# Altium integrated library Res-THP_V2.IntLib: 460 symbols (part 2 of 3)
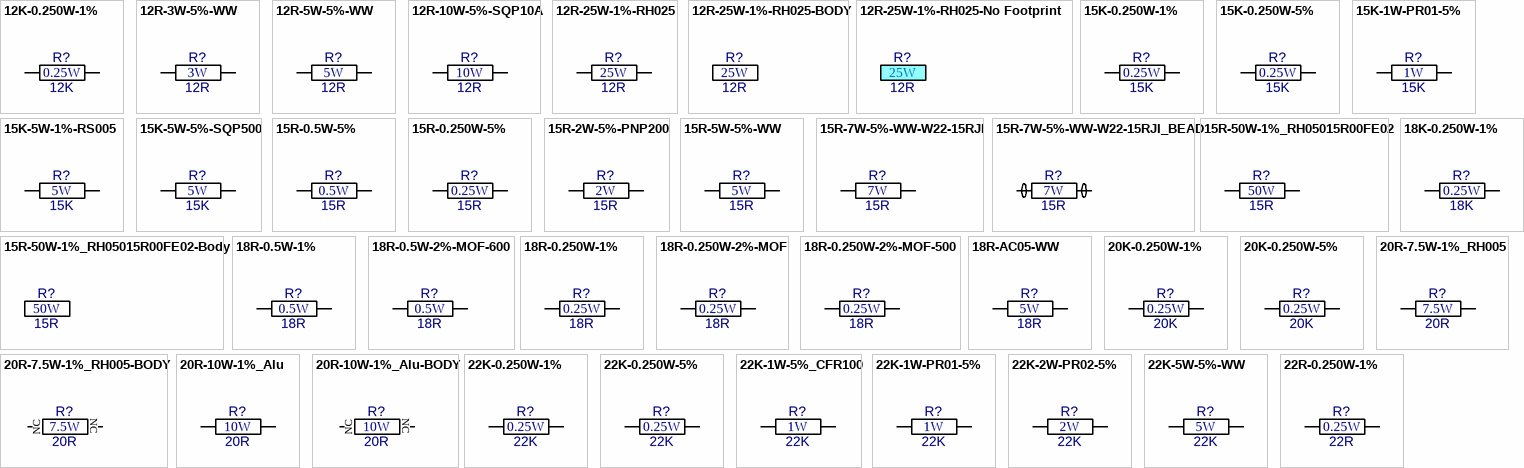
[diagram p12: symbols 12K-0.250W-1% to 22R-0.250W-1%]

## 15K-5W-1%-RS005
designator R?  value 15K  Watt: 5W  (hidden comment: 15K-5W-1%-RS005)
Resistor Wirewound; Manufacturer: Vishay; Part Number: RS00515K00FE12; Tol: 1%; Package: RES-RS005; EDM-PN: *; Text2: *; Text1: *
footprint RES-RS005 (RS005  22.23x7.92mm)
pins: 1, 2

## 15K-5W-5%-SQP500
designator R?  value 15K  Watt: 5W  (hidden comment: 15K-5W-5%-SQP500)
Resistor Cement; Manufacturer: Yageo; Part Number: SQP500JB-15K; Tol: 5%; Package: RES-SQP500; EDM-PN: *; Text2: *; Text1: *
footprint RES-SQP500 (SQP500  22.0x9.5mm)
pins: 1, 2

## 15R-0.5W-5%
designator R?, comment value 15R  Watt: 0.5W  (hidden comment: 15R-0.5W-5%_H)
Resistor Carbon; Manufacturer: Various; Part Number: 15R 5% 0.5W; Tol: 5%; Package: RES-0.5W; EDM-PN: *; Text2: *; Text1: *
footprint RES-0.5W (RES-0.5W 10.0x3.8mm)
pins: 1, 2

## 15R-0.250W-5%
designator R?, comment value 15R  Watt: 0.25W  (hidden comment: 15R-0.250W-5%_H)
Resistor Carbon; Manufacturer: Various; Part Number: 15R 5% 0.25W; Tol: 5%; Package: RES-0.250W; EDM-PN: *; Text2: *; Text1: *
footprint RES-0.250W (Res 0.25W 7.6x2.3mm)
pins: 1, 2

## 15R-2W-5%-PNP200
designator R?, comment value 15R  Watt: 2W  (hidden comment: PNP200JR-52-15R)
Resistor Wirewound Flame Retardant Safety; Manufacturer: Yageo; Tol: 5%; Part Number: PNP200JR-52-15R; Package: RES-PNP200; EDM-PN: *; Text2: *; Text1: *
footprint RES-PNP200 (RES PNP200 9.0x3.5mm)
pins: 1, 2

## 15R-5W-5%-WW
designator R?  value 15R  Watt: 5W  (hidden comment: 15R-5W-5%-WW)
Resistor Wirewound; Manufacturer: Various; Part Number: 15R 5% 5W WW; Tol: 5%; Package: RES-5W-WW; EDM-PN: *; Text2: *; Text1: *
footprint Res-5W-WW (Res 5W WW 17.0x7.5mm)
pins: 1, 2

## 15R-7W-5%-WW-W22-15RJI
designator R?, comment value 15R  Watt: 7W  (hidden comment: W22-15RJI)
Resistor Wirewound; Manufacturer: TT Electronics/Welwyn; Tol: 5%; Part Number: W22-15RJI; Package: RES-W22; EDM-PN: *; Text2: *; Text1: *
footprint Res-W22 (Res W22 22.0x8.0mm)
pins: 1, 2

## 15R-7W-5%-WW-W22-15RJI_BEAD
designator R?, comment value 15R  Watt: 7W  (hidden comment: W22-15RJI)
Resistor Wirewound and Bead; Manufacturer: TT Electronics/Welwyn & RS; Part Number: W22-15RJI & 536-4062; Tol: 5%; Package: RES-W22-BEAD; EDM-PN: *; Text2: *; Text1: *
footprint Res-W22 (Res W22 22.0x8.0mm)
pins: 1, 2

## 15R-50W-1%_RH05015R00FE02
designator R?, comment value 15R  Watt: 50W  (hidden comment: RH05015R00FE02)
Resistor Chassis Mount Aluminum 50Watt; Manufacturer: Vishay; Tol: 1%; Part Number: RH05015R00FE02; Package: RES-AL-50W; EDM-PN: *; Text2: *; Text1: *
footprint RES-AL-50W (Aluminum 50Watt 50.0x29.0mm)
pins: 1, 2

## 15R-50W-1%_RH05015R00FE02-Body
designator R?, comment value 15R  Watt: 50W  (hidden comment: RH05015R00FE02)
Resistor Chassis Mount Aluminum 50Watt; Manufacturer: Vishay; Tol: 1%; Part Number: RH05015R00FE02; Package: RES-AL-50W Body; EDM-PN: *; Text2: *; Text1: *
footprint RES-AL-50W Body (Aluminum 50Watt 50.0x29.0mm)

## 18K-0.250W-1%
designator R?, comment value 18K  Watt: 0.25W  (hidden comment: 18K-0.250W-1%_H)
Resistor Metal Film; Manufacturer: Various; Part Number: 18K 1% 0.25W; Tol: 1%; Package: RES-0.250W; EDM-PN: *; Text2: *; Text1: *
footprint RES-0.250W (Res 0.25W 7.6x2.3mm)
pins: 1, 2

## 18R-0.5W-1%
designator R?, comment value 18R  Watt: 0.5W  (hidden comment: 18R-0.5W-1%_H)
Resistor Metal Film; Manufacturer: Various; Part Number: 18R 1% 0.5W; Tol: 1%; Package: RES-0.5W; EDM-PN: *; Text2: *; Text1: *
footprint RES-0.5W (RES-0.5W 10.0x3.8mm)
pins: 1, 2

## 18R-0.5W-2%-MOF-600
designator R?, comment value 18R  Watt: 0.5W  (hidden comment: 18R-0.5W-2%)
Resistor Metal Oxide Film; Manufacturer: Various; Part Number: 18R 2% 0.5W MOF; Tol: 2%; Package: RES-0.5W-600; EDM-PN: *; Text2: *; Text1: *
footprint RES-0.5W-600 (RES-0.5W 10.0x3.8mm)
pins: 1, 2

## 18R-0.250W-1%
designator R?, comment value 18R  Watt: 0.25W  (hidden comment: 18R-0.250W-1%_H)
Resistor Metal Film; Manufacturer: Various; Part Number: 18R 1% 0.25W; Tol: 1%; Package: RES-0.250W; EDM-PN: *; Text2: *; Text1: *
footprint RES-0.250W (Res 0.25W 7.6x2.3mm)
pins: 1, 2

## 18R-0.250W-2%-MOF
designator R?, comment value 18R  Watt: 0.25W  (hidden comment: 18R-0.250W-2%)
Resistor Metal Oxide Film; Manufacturer: Various; Part Number: 18R 2% 0.25W MOF; Tol: 2%; Package: RES-0.250W; EDM-PN: *; Text2: *; Text1: *
footprint RES-0.250W (Res 0.25W 7.6x2.3mm)
pins: 1, 2

## 18R-0.250W-2%-MOF-500
designator R?, comment value 18R  Watt: 0.25W  (hidden comment: 18R-0.250W-2%)
Resistor Metal Oxide Film; Manufacturer: Various; Part Number: 18R 2% 0.25W MOF; Tol: 2%; Package: RES-0.250W-500; EDM-PN: *; Text2: *; Text1: *
footprint RES-0.250W-500 (Res 0.25W 7.6x2.3mm)
pins: 1, 2

## 18R-AC05-WW
designator R?  value 18R  Watt: 5W  (hidden comment: 18R-AC05-WW)
Resistor Wirewound; Manufacturer: Various; Part Number: 18R 5% AC05; Tol: 5%; Package: RES-AC05; EDM-PN: *; Text2: *; Text1: *
footprint Res-AC05 (Res AC05 18.0x10.0mm)
pins: 1, 2

## 20K-0.250W-1%
designator R?  value 20K  Watt: 0.25W  (hidden comment: 20K-0.250W-1%)
Resistor Metal Film; Manufacturer: Various; Part Number: 20K 1% 0.25W; Tol: 1%; Package: RES-0.250W; EDM-PN: *; Text2: *; Text1: *
footprint RES-0.250W (Res 0.25W 7.6x2.3mm)
pins: 1, 2

## 20K-0.250W-5%
designator R?, comment value 20K  Watt: 0.25W  (hidden comment: 20K-0.250W-5%_H)
Resistor Carbon; Manufacturer: Various; Part Number: 20K 5% 0.25W; Tol: 5%; Package: RES-0.250W; EDM-PN: *; Text2: *; Text1: *
footprint RES-0.250W (Res 0.25W 7.6x2.3mm)
pins: 1, 2

## 20R-7.5W-1%_RH005
designator R?  value 20R  Watt: 7.5W  (hidden comment: 20R-7.5W-1%_RH005)
Resistor Chassis Mount Aluminum 7.5Watt; Manufacturer: Vishay; Part Number: RH00520R00FC02; Tol: 1%; Package: RES-AL 5W; EDM-PN: *; Text2: *; Text1: *
footprint RES-AL 5W (RH005 11.28x8.84mm)
pins: 1, 2

## 20R-7.5W-1%_RH005-BODY
designator R?, comment value 20R  Watt: 7.5W  (hidden comment: 20R-7.5W-1%_RH005)
Resistor Chassis Mount Aluminum 7.5Watt; Manufacturer: Vishay; Part Number: RH00520R00FC02; Tol: 1%; Package: RES-AL 5W Body; EDM-PN: *; Text2: *; Text1: *
footprint RES-AL 5W Body (RH005 11.28x8.84mm)
text: NC

## 20R-10W-1%_Alu
designator R?  value 20R  Watt: 10W  (hidden comment: 20R-10W-1%_Alu)
Resistor Chassis Mount Aluminum; Manufacturer: Various; Part Number: 20R 10W 1% Aluminum; Tol: 1%; Package: RES-AL 10W; EDM-PN: *; Text2: *; Text1: *
footprint RES-AL 10W (RH010 19.2x21.0mm)
pins: 1, 2

## 20R-10W-1%_Alu-BODY
designator R?, comment value 20R  Watt: 10W  (hidden comment: 20R-10W-1%_Alu)
Resistor Chassis Mount Aluminum; Manufacturer: Various; Part Number: 20R 10W 1% Aluminum; Tol: 1%; Package: RES-AL 10W Body; EDM-PN: *; Text2: *; Text1: *
footprint RES-AL 10W Body (RH010 19.2x21.0mm)
text: NC

## 22K-0.250W-1%
designator R?, comment value 22K  Watt: 0.25W  (hidden comment: 22K-0.250W-1%_H)
Resistor Metal Film; Manufacturer: Various; Part Number: 22K 1% 0.25W; Tol: 1%; Package: RES-0.250W; EDM-PN: *; Text2: *; Text1: *
footprint RES-0.250W (Res 0.25W 7.6x2.3mm)
pins: 1, 2

## 22K-0.250W-5%
designator R?, comment value 22K  Watt: 0.25W  (hidden comment: 22K-0.250W-5%_H)
Resistor Carbon; Manufacturer: Various; Part Number: 22K 5% 0.25W; Tol: 5%; Package: RES-0.250W; EDM-PN: *; Text2: *; Text1: *
footprint RES-0.250W (Res 0.25W 7.6x2.3mm)
pins: 1, 2

## 22K-1W-5%_CFR100
designator R?, comment value 22K  Watt: 1W  (hidden comment: CFR100J22K)
Resistor Carbon Film; Manufacturer: Tyco; Tol: 5%; Part Number: CFR100J22K; Package: RES-CFR100; EDM-PN: *; Text2: *; Text1: *
footprint RES-CFR100 (RES CFR100 12.0x5.0mm)
pins: 1, 2

## 22K-1W-PR01-5%
designator R?  value 22K  Watt: 1W  (hidden comment: 22K-1W-PR01-5%)
Resistor Power Metal Film; Manufacturer: Various; Part Number: 22K 5% 1W; Tol: 5%; Package: RES-PR01; EDM-PN: *; Text2: *; Text1: *
footprint RES-PR01 (RES-PR01 6.5x2.5mm)
pins: 1, 2

## 22K-2W-PR02-5%
designator R?  value 22K  Watt: 2W  (hidden comment: 22K-2W-PR02-5%)
Resistor Power Metal Film; Manufacturer: Various; Part Number: 22K 5% 2W; Tol: 5%; Package: RES-PR02; EDM-PN: *; Text2: *; Text1: *
footprint RES-PR02 (RES 2W PMW 10.0x3.9mm)
pins: 1, 2

## 22K-5W-5%-WW
designator R?  value 22K  Watt: 5W  (hidden comment: 22K-5W-5%-WW)
Resistor Wirewound; Manufacturer: Various; Part Number: 22K 5% 5W WW; Tol: 5%; Package: RES-5W-WW; EDM-PN: *; Text2: *; Text1: *
footprint Res-5W-WW (Res 5W WW 17.0x7.5mm)
pins: 1, 2

## 22R-0.250W-1%
designator R?, comment value 22R  Watt: 0.25W  (hidden comment: 22R-0.250W-1%_H)
Resistor Metal Film; Manufacturer: Various; Part Number: 22R 1% 0.25W; Tol: 1%; Package: RES-0.250W; EDM-PN: *; Text2: *; Text1: *
footprint RES-0.250W (Res 0.25W 7.6x2.3mm)
pins: 1, 2

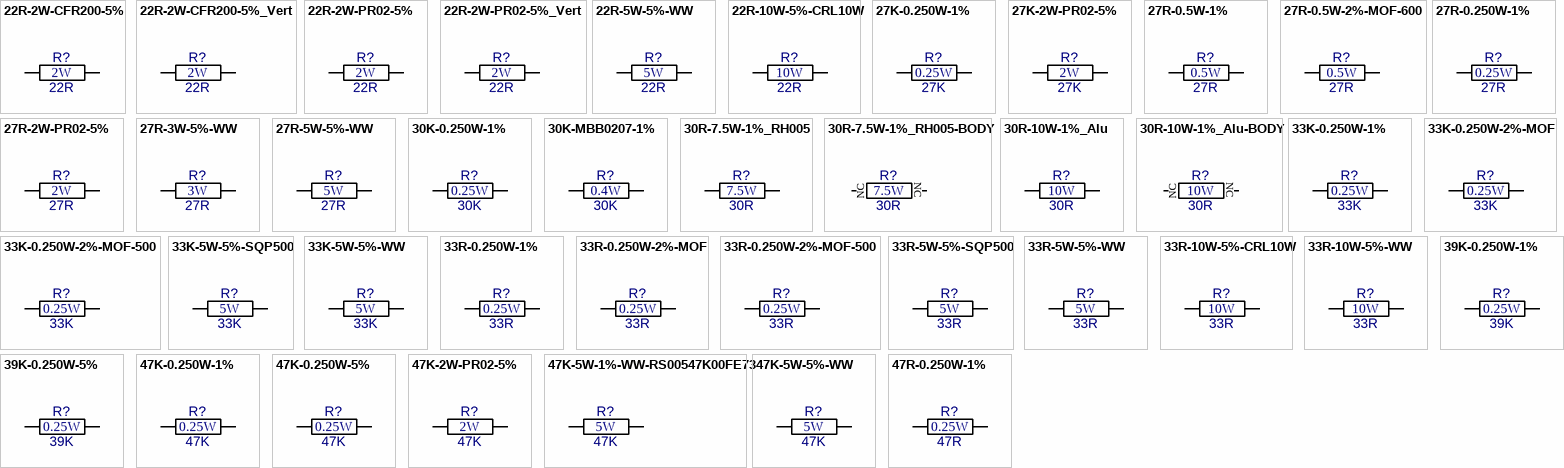
[diagram p6: symbols 22R-2W-CFR200-5% to 47R-0.250W-1%]

## 22R-2W-CFR200-5%
designator R?, comment value 22R  Watt: 2W  (hidden comment: CFR200J22R)
Resistor Carbon Film; Manufacturer: Various; Tol: 5%; Part Number: CFR200J22R; Package: RES-CFR200; EDM-PN: *; Text2: *; Text1: *
footprint Res-CFR200 (Res CFR200 16.0x5.5mm)
pins: 1, 2

## 22R-2W-CFR200-5%_Vert
designator R?, comment value 22R  Watt: 2W  (hidden comment: CFR200J22R)
Resistor Carbon Film; Manufacturer: Various; Tol: 5%; Part Number: CFR200J22R; Package: Res-CFR200-Vert; EDM-PN: *; Text2: *; Text1: *
footprint Res-CFR200-Vert (Res CFR200 16.0x5.5mm)
pins: 1, 2

## 22R-2W-PR02-5%
designator R?  value 22R  Watt: 2W  (hidden comment: 22R-2W-PR02-5%)
Resistor Power Metal Film; Manufacturer: Various; Part Number: 22R 5% 2W; Tol: 5%; Package: RES-PR02; EDM-PN: *; Text2: *; Text1: *
footprint RES-PR02 (RES 2W PMW 10.0x3.9mm)
pins: 1, 2

## 22R-2W-PR02-5%_Vert
designator R?, comment value 22R  Watt: 2W  (hidden comment: 22R-2W-PR02-5%)
Resistor Power Metal Film; Manufacturer: Various; Part Number: 22R 5% 2W; Tol: 5%; Package: RES-PR02-VERT; EDM-PN: *; Text2: *; Text1: *
footprint RES-PR02-VERT (RES 2W PMW 10.0x3.9mm Vertical)
pins: 1, 2

## 22R-5W-5%-WW
designator R?  value 22R  Watt: 5W  (hidden comment: 22R-5W-5%-WW)
Resistor Wirewound; Manufacturer: Various; Part Number: 22R 5% 5W WW; Tol: 5%; Package: RES-5W-WW; EDM-PN: *; Text2: *; Text1: *
footprint Res-5W-WW (Res 5W WW 17.0x7.5mm)
pins: 1, 2

## 22R-10W-5%-CRL10W
designator R?  value 22R  Watt: 10W  (hidden comment: 22R-10W-5%-CRL10W)
Resistor Wirewound Cement; Manufacturer: SR Passives; Part Number: CRL10W 22R 5%; Tol: 5%; Package: RES-CRL10W; EDM-PN: *; Text2: *; Text1: *
footprint RES-CRL10W (CRL10W  48.0x9.5mm)
pins: 1, 2

## 27K-0.250W-1%
designator R?, comment value 27K  Watt: 0.25W  (hidden comment: 27K-0.250W-1%_H)
Resistor Metal Film; Manufacturer: Various; Part Number: 27K 1% 0.25W; Tol: 1%; Package: RES-0.250W; EDM-PN: *; Text2: *; Text1: *
footprint RES-0.250W (Res 0.25W 7.6x2.3mm)
pins: 1, 2

## 27K-2W-PR02-5%
designator R?  value 27K  Watt: 2W  (hidden comment: 27K-2W-PR02-5%)
Resistor Power Metal Film; Manufacturer: Various; Part Number: 27K 5% 2W; Tol: 5%; Package: RES-PR02; EDM-PN: *; Text2: *; Text1: *
footprint RES-PR02 (RES 2W PMW 10.0x3.9mm)
pins: 1, 2

## 27R-0.5W-1%
designator R?, comment value 27R  Watt: 0.5W  (hidden comment: 27R-0.5W-1%_H)
Resistor Metal Film; Manufacturer: Various; Part Number: 27R 1% 0.5W; Tol: 1%; Package: RES-0.5W; EDM-PN: *; Text2: *; Text1: *
footprint RES-0.5W (RES-0.5W 10.0x3.8mm)
pins: 1, 2

## 27R-0.5W-2%-MOF-600
designator R?, comment value 27R  Watt: 0.5W  (hidden comment: 27R-0.5W-2%)
Resistor Metal Oxide Film; Manufacturer: Various; Part Number: 27R 2% 0.5W MOF; Tol: 2%; Package: RES-0.5W-600; EDM-PN: *; Text2: *; Text1: *
footprint RES-0.5W-600 (RES-0.5W 10.0x3.8mm)
pins: 1, 2

## 27R-0.250W-1%
designator R?, comment value 27R  Watt: 0.25W  (hidden comment: 27R-0.250W-1%_H)
Resistor Metal Film; Manufacturer: Various; Part Number: 27R 1% 0.25W; Tol: 1%; Package: RES-0.250W; EDM-PN: *; Text2: *; Text1: *
footprint RES-0.250W (Res 0.25W 7.6x2.3mm)
pins: 1, 2

## 27R-2W-PR02-5%
designator R?  value 27R  Watt: 2W  (hidden comment: 27R-2W-PR02-5%)
Resistor Power Metal Film; Manufacturer: Various; Part Number: 27R 5% 2W; Tol: 5%; Package: RES-PR02; EDM-PN: *; Text2: *; Text1: *
footprint RES-PR02 (RES 2W PMW 10.0x3.9mm)
pins: 1, 2

## 27R-3W-5%-WW
designator R?  value 27R  Watt: 3W  (hidden comment: 27R-3W-5%-WW)
Resistor Wirewound; Manufacturer: Various; Part Number: 27R 5% 3W WW; Tol: 5%; Package: RES-3W-WW; EDM-PN: *; Text2: *; Text1: *
footprint Res-3W-WW (Res 3W WW 13.0x5.5mm)
pins: 1, 2

## 27R-5W-5%-WW
designator R?  value 27R  Watt: 5W  (hidden comment: 27R-5W-5%-WW)
Resistor Wirewound; Manufacturer: Various; Part Number: 27R 5% 5W WW; Tol: 5%; Package: RES-5W-WW; EDM-PN: *; Text2: *; Text1: *
footprint Res-5W-WW (Res 5W WW 17.0x7.5mm)
pins: 1, 2

## 30K-0.250W-1%
designator R?, comment value 30K  Watt: 0.25W  (hidden comment: 30K-0.250W-1%_H)
Resistor Metal Film; Manufacturer: Various; Part Number: 30K 1% 0.25W; Tol: 1%; Package: RES-0.250W; EDM-PN: *; Text2: *; Text1: *
footprint RES-0.250W (Res 0.25W 7.6x2.3mm)
pins: 1, 2

## 30K-MBB0207-1%
designator R?, comment value 30K  Watt: 0.4W  (hidden comment: 30K-MBB0207-1%_H)
Resistor Metal Film; Manufacturer: Vishay; Part Number: 30K 1% MBB0207; Tol: 1%; Package: RES-MBB0207; EDM-PN: *; Text2: *; Text1: *; Reutech PN: 5905-99-0303
footprint RES-MBB0207 (MBB0207 6.3x2.5mm)
pins: 1, 2

## 30R-7.5W-1%_RH005
designator R?  value 30R  Watt: 7.5W  (hidden comment: 30R-7.5W-1%_RH005)
Resistor Chassis Mount Aluminum 7.5Watt; Manufacturer: Vishay; Part Number: RH00530R00FC02; Tol: 1%; Package: RES-AL 5W; EDM-PN: *; Text2: *; Text1: *
footprint RES-AL 5W (RH005 11.28x8.84mm)
pins: 1, 2

## 30R-7.5W-1%_RH005-BODY
designator R?, comment value 30R  Watt: 7.5W  (hidden comment: 30R-7.5W-1%_RH005)
Resistor Chassis Mount Aluminum 7.5Watt; Manufacturer: Vishay; Part Number: RH00530R00FC02; Tol: 1%; Package: RES-AL 5W Body; EDM-PN: *; Text2: *; Text1: *
footprint RES-AL 5W Body (RH005 11.28x8.84mm)
text: NC

## 30R-10W-1%_Alu
designator R?  value 30R  Watt: 10W  (hidden comment: 30R-10W-1%_Alu)
Resistor Chassis Mount Aluminum; Manufacturer: Various; Part Number: 30R 10W 1% Aluminum; Tol: 1%; Package: RES-AL 10W; EDM-PN: *; Text2: *; Text1: *
footprint RES-AL 10W (RH010 19.2x21.0mm)
pins: 1, 2

## 30R-10W-1%_Alu-BODY
designator R?, comment value 30R  Watt: 10W  (hidden comment: 30R-10W-1%_Alu)
Resistor Chassis Mount Aluminum; Manufacturer: Various; Part Number: 30R 10W 1% Aluminum; Tol: 1%; Package: RES-AL 10W Body; EDM-PN: *; Text2: *; Text1: *
footprint RES-AL 10W Body (RH010 19.2x21.0mm)
text: NC

## 33K-0.250W-1%
designator R?, comment value 33K  Watt: 0.25W  (hidden comment: 33K-0.250W-1%_H)
Resistor Metal Film; Manufacturer: Various; Part Number: 33K 1% 0.25W; Tol: 1%; Package: RES-0.250W; EDM-PN: *; Text2: *; Text1: *
footprint RES-0.250W (Res 0.25W 7.6x2.3mm)
pins: 1, 2

## 33K-0.250W-2%-MOF
designator R?, comment value 33K  Watt: 0.25W  (hidden comment: 33K-0.250W-2%)
Resistor Metal Oxide Film; Manufacturer: Various; Part Number: 33K 2% 0.25W MOF; Tol: 2%; Package: RES-0.250W; EDM-PN: *; Text2: *; Text1: *
footprint RES-0.250W (Res 0.25W 7.6x2.3mm)
pins: 1, 2

## 33K-0.250W-2%-MOF-500
designator R?, comment value 33K  Watt: 0.25W  (hidden comment: 33K-0.250W-2%)
Resistor Metal Oxide Film; Manufacturer: Various; Part Number: 33K 2% 0.25W MOF; Tol: 2%; Package: RES-0.250W-500; EDM-PN: *; Text2: *; Text1: *
footprint RES-0.250W-500 (Res 0.25W 7.6x2.3mm)
pins: 1, 2

## 33K-5W-5%-SQP500
designator R?  value 33K  Watt: 5W  (hidden comment: 33K-5W-5%-SQP500)
Resistor Cement Wirewound; Manufacturer: Yageo; Part Number: SQP500-33K-J; Tol: 5%; Package: RES-SQP500; EDM-PN: *; Text2: *; Text1: *
footprint RES-SQP500 (SQP500  22.0x9.5mm)
pins: 1, 2

## 33K-5W-5%-WW
designator R?  value 33K  Watt: 5W  (hidden comment: 33K-5W-5%-WW)
Resistor Wirewound; Manufacturer: Various; Part Number: 33K 5% 5W WW; Tol: 5%; Package: RES-5W-WW; EDM-PN: *; Text2: *; Text1: *
footprint Res-5W-WW (Res 5W WW 17.0x7.5mm)
pins: 1, 2

## 33R-0.250W-1%
designator R?, comment value 33R  Watt: 0.25W  (hidden comment: 33R-0.250W-1%_H)
Resistor Metal Film; Manufacturer: Various; Part Number: 33R 1% 0.25W; Tol: 1%; Package: RES-0.250W; EDM-PN: *; Text2: *; Text1: *
footprint RES-0.250W (Res 0.25W 7.6x2.3mm)
pins: 1, 2

## 33R-0.250W-2%-MOF
designator R?, comment value 33R  Watt: 0.25W  (hidden comment: 33R-0.250W-2%)
Resistor Metal Oxide Film; Manufacturer: Various; Part Number: 33R 2% 0.25W MOF; Tol: 2%; Package: RES-0.250W; EDM-PN: *; Text2: *; Text1: *
footprint RES-0.250W (Res 0.25W 7.6x2.3mm)
pins: 1, 2

## 33R-0.250W-2%-MOF-500
designator R?, comment value 33R  Watt: 0.25W  (hidden comment: 33R-0.250W-2%)
Resistor Metal Oxide Film; Manufacturer: Various; Part Number: 33R 2% 0.25W MOF; Tol: 2%; Package: RES-0.250W-500; EDM-PN: *; Text2: *; Text1: *
footprint RES-0.250W-500 (Res 0.25W 7.6x2.3mm)
pins: 1, 2

## 33R-5W-5%-SQP500
designator R?  value 33R  Watt: 5W  (hidden comment: 33R-5W-5%-SQP500)
Resistor Cement; Manufacturer: Yageo; Part Number: SQP500JB-33R; Tol: 5%; Package: RES-SQP500; EDM-PN: *; Text2: *; Text1: *
footprint RES-SQP500 (SQP500  22.0x9.5mm)
pins: 1, 2

## 33R-5W-5%-WW
designator R?  value 33R  Watt: 5W  (hidden comment: 33R-5W-5%-WW)
Resistor Wirewound; Manufacturer: Various; Part Number: 33R 5% 5W WW; Tol: 5%; Package: RES-5W-WW; EDM-PN: *; Text2: *; Text1: *
footprint Res-5W-WW (Res 5W WW 17.0x7.5mm)
pins: 1, 2

## 33R-10W-5%-CRL10W
designator R?  value 33R  Watt: 10W  (hidden comment: 33R-10W-5%-CRL10W)
Resistor Wirewound Cement; Manufacturer: SR Passives; Part Number: CRL10W 33R 5%; Tol: 5%; Package: RES-CRL10W; EDM-PN: *; Text2: *; Text1: *
footprint RES-CRL10W (CRL10W  48.0x9.5mm)
pins: 1, 2

## 33R-10W-5%-WW
designator R?  value 33R  Watt: 10W  (hidden comment: 33R-10W-5%-WW)
Resistor Wirewound; Manufacturer: Various; Part Number: 33R 5% 10W WW; Tol: 5%; Package: RES-10W-WW; EDM-PN: *; Text2: *; Text1: *
footprint Res-10W-WW (Res 10W WW 44.0x8.0mm)
pins: 1, 2

## 39K-0.250W-1%
designator R?, comment value 39K  Watt: 0.25W  (hidden comment: 39K-0.250W-1%_H)
Resistor Metal Film; Manufacturer: Various; Part Number: 39K 1% 0.25W; Tol: 1%; Package: RES-0.250W; EDM-PN: *; Text2: *; Text1: *
footprint RES-0.250W (Res 0.25W 7.6x2.3mm)
pins: 1, 2

## 39K-0.250W-5%
designator R?, comment value 39K  Watt: 0.25W  (hidden comment: 39K-0.250W-5%_H)
Resistor Carbon; Manufacturer: Various; Part Number: 39K 5% 0.25W; Tol: 5%; Package: RES-0.250W; EDM-PN: *; Text2: *; Text1: *
footprint RES-0.250W (Res 0.25W 7.6x2.3mm)
pins: 1, 2

## 47K-0.250W-1%
designator R?, comment value 47K  Watt: 0.25W  (hidden comment: 47K-0.250W-1%_H)
Resistor Metal Film; Manufacturer: Various; Part Number: 47K 1% 0.25W; Tol: 1%; Package: RES-0.250W; EDM-PN: *; Text2: *; Text1: *
footprint RES-0.250W (Res 0.25W 7.6x2.3mm)
pins: 1, 2

## 47K-0.250W-5%
designator R?, comment value 47K  Watt: 0.25W  (hidden comment: 47K-0.250W-5%_H)
Resistor Carbon; Manufacturer: Various; Part Number: 47K 5% 0.25W; Tol: 5%; Package: RES-0.250W; EDM-PN: *; Text2: *; Text1: *
footprint RES-0.250W (Res 0.25W 7.6x2.3mm)
pins: 1, 2

## 47K-2W-PR02-5%
designator R?  value 47K  Watt: 2W  (hidden comment: 47K-2W-PR02-5%)
Resistor Power Metal Film; Manufacturer: Various; Part Number: 47K 5% 2W; Tol: 5%; Package: RES-PR02; EDM-PN: *; Text2: *; Text1: *
footprint RES-PR02 (RES 2W PMW 10.0x3.9mm)
pins: 1, 2

## 47K-5W-1%-WW-RS00547K00FE73
designator R?, comment value 47K  Watt: 5W  (hidden comment: RS00547K00FE73)
Resistor Wirewound Moisture Resistant; Manufacturer: Vishay; Tol: 1%; Part Number: RS00547K00FE73; Package: RES-RS005; EDM-PN: *; Text2: *; Text1: *
footprint RES-RS005 (RS005  22.23x7.92mm)
pins: 1, 2

## 47K-5W-5%-WW
designator R?  value 47K  Watt: 5W  (hidden comment: 47K-5W-5%-WW)
Resistor Wirewound; Manufacturer: Various; Part Number: 47K 5% 5W WW; Tol: 5%; Package: RES-5W-WW; EDM-PN: *; Text2: *; Text1: *
footprint Res-5W-WW (Res 5W WW 17.0x7.5mm)
pins: 1, 2

## 47R-0.250W-1%
designator R?, comment value 47R  Watt: 0.25W  (hidden comment: 47R-0.250W-1%_H)
Resistor Metal Film; Manufacturer: Various; Part Number: 47R 1% 0.25W; Tol: 1%; Package: RES-0.250W; EDM-PN: *; Text2: *; Text1: *
footprint RES-0.250W (Res 0.25W 7.6x2.3mm)
pins: 1, 2

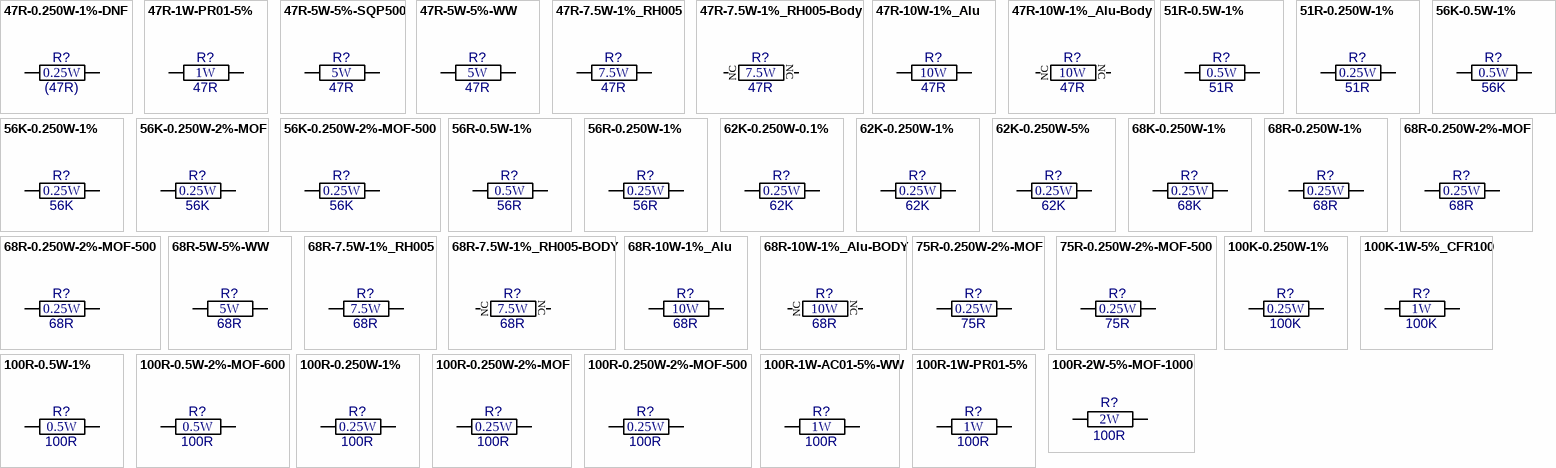
[diagram p7: symbols 47R-0.250W-1%-DNF to 100R-2W-5%-MOF-1000]

## 47R-0.250W-1%-DNF
designator R?, comment value (47R)  Watt: 0.25W  (hidden comment: 47R-0.250W-1%_H-DNF)
Resistor Metal Film - Do not Fit; Manufacturer: Various; Part Number: DNF - 47R 1% 0.25W; Tol: 1%; Package: RES-0.250W; EDM-PN: *; Text2: *; Text1: *
footprint RES-0.250W (Res 0.25W 7.6x2.3mm)
pins: 1, 2

## 47R-1W-PR01-5%
designator R?  value 47R  Watt: 1W  (hidden comment: 47R-1W-PR01-5%)
Resistor Power Metal Film; Manufacturer: Various; Part Number: 47R 5% 1W; Tol: 5%; Package: RES-PR01; EDM-PN: *; Text2: *; Text1: *
footprint RES-PR01 (RES-PR01 6.5x2.5mm)
pins: 1, 2

## 47R-5W-5%-SQP500
designator R?  value 47R  Watt: 5W  (hidden comment: 47R-5W-5%-SQP500)
Resistor Cement; Manufacturer: Yageo; Part Number: SQP500JB-47R; Tol: 5%; Package: RES-SQP500; EDM-PN: *; Text2: *; Text1: *
footprint RES-SQP500 (SQP500  22.0x9.5mm)
pins: 1, 2

## 47R-5W-5%-WW
designator R?  value 47R  Watt: 5W  (hidden comment: 47R-5W-5%-WW)
Resistor Wirewound; Manufacturer: Various; Part Number: 47R 5% 5W WW; Tol: 5%; Package: RES-5W-WW; EDM-PN: *; Text2: *; Text1: *
footprint Res-5W-WW (Res 5W WW 17.0x7.5mm)
pins: 1, 2

## 47R-7.5W-1%_RH005
designator R?  value 47R  Watt: 7.5W  (hidden comment: 47R-7.5W-1%_RH005)
Resistor Chassis Mount Aluminum 7.5Watt; Manufacturer: Vishay; Part Number: RH00547R00FC02; Tol: 1%; Package: RES-AL 5W; EDM-PN: *; Text2: *; Text1: *
footprint RES-AL 5W (RH005 11.28x8.84mm)
pins: 1, 2

## 47R-7.5W-1%_RH005-Body
designator R?, comment value 47R  Watt: 7.5W  (hidden comment: 47R-7.5W-1%_RH005)
Resistor Chassis Mount Aluminum 7.5Watt; Manufacturer: Vishay; Part Number: RH00547R00FC02; Tol: 1%; Package: RES-AL 5W Body; EDM-PN: *; Text2: *; Text1: *
footprint RES-AL 5W Body (RH005 11.28x8.84mm)
text: NC

## 47R-10W-1%_Alu
designator R?  value 47R  Watt: 10W  (hidden comment: 47R-10W-1%_Alu)
Resistor Chassis Mount Aluminum; Manufacturer: Various; Part Number: 47R 10W 1% Aluminum; Tol: 1%; Package: RES-AL 10W; EDM-PN: *; Text2: *; Text1: *
footprint RES-AL 10W (RH010 19.2x21.0mm)
pins: 1, 2

## 47R-10W-1%_Alu-Body
designator R?, comment value 47R  Watt: 10W  (hidden comment: 47R-10W-1%_Alu)
Resistor Chassis Mount Aluminum; Manufacturer: Various; Part Number: 47R 10W 1% Aluminum; Tol: 1%; Package: RES-AL 10W Body; EDM-PN: *; Text2: *; Text1: *
footprint RES-AL 10W Body (RH010 19.2x21.0mm)
text: NC

## 51R-0.5W-1%
designator R?, comment value 51R  Watt: 0.5W  (hidden comment: 51R-0.5W-1%_H)
Resistor Metal Film; Manufacturer: Various; Part Number: 51R 1% 0.5W; Tol: 1%; Package: RES-0.5W; EDM-PN: *; Text2: *; Text1: *
footprint RES-0.5W (RES-0.5W 10.0x3.8mm)
pins: 1, 2

## 51R-0.250W-1%
designator R?, comment value 51R  Watt: 0.25W  (hidden comment: 51R-0.250W-1%_H)
Resistor Metal Film; Manufacturer: Various; Part Number: 51R 1% 0.25W; Tol: 1%; Package: RES-0.250W; EDM-PN: *; Text2: *; Text1: *
footprint RES-0.250W (Res 0.25W 7.6x2.3mm)
pins: 1, 2

## 56K-0.5W-1%
designator R?, comment value 56K  Watt: 0.5W  (hidden comment: 56K-0.5W-1%_H)
Resistor Metal Film; Manufacturer: Various; Part Number: 56K 1% 0.5W; Tol: 1%; Package: RES-0.5W; EDM-PN: *; Text2: *; Text1: *
footprint RES-0.5W (RES-0.5W 10.0x3.8mm)
pins: 1, 2

## 56K-0.250W-1%
designator R?, comment value 56K  Watt: 0.25W  (hidden comment: 56K-0.250W-1%_H)
Resistor Metal Film; Manufacturer: Various; Part Number: 56K 1% 0.25W; Tol: 1%; Package: RES-0.250W; EDM-PN: *; Text2: *; Text1: *
footprint RES-0.250W (Res 0.25W 7.6x2.3mm)
pins: 1, 2

## 56K-0.250W-2%-MOF
designator R?, comment value 56K  Watt: 0.25W  (hidden comment: 56K-0.250W-2%)
Resistor Metal Oxide Film; Manufacturer: Various; Part Number: 56K 2% 0.25W MOF; Tol: 2%; Package: RES-0.250W; EDM-PN: *; Text2: *; Text1: *
footprint RES-0.250W (Res 0.25W 7.6x2.3mm)
pins: 1, 2

## 56K-0.250W-2%-MOF-500
designator R?, comment value 56K  Watt: 0.25W  (hidden comment: 56K-0.250W-2%)
Resistor Metal Oxide Film; Manufacturer: Various; Part Number: 56K 2% 0.25W MOF; Tol: 2%; Package: RES-0.250W-500; EDM-PN: *; Text2: *; Text1: *
footprint RES-0.250W-500 (Res 0.25W 7.6x2.3mm)
pins: 1, 2

## 56R-0.5W-1%
designator R?, comment value 56R  Watt: 0.5W  (hidden comment: 56R-0.5W-1%_H)
Resistor Metal Film; Manufacturer: Various; Part Number: 56R 1% 0.5W; Tol: 1%; Package: RES-0.5W; EDM-PN: *; Text2: *; Text1: *
footprint RES-0.5W (RES-0.5W 10.0x3.8mm)
pins: 1, 2

## 56R-0.250W-1%
designator R?, comment value 56R  Watt: 0.25W  (hidden comment: 56R-0.250W-1%_H)
Resistor Metal Film; Manufacturer: Various; Part Number: 56R 1% 0.25W; Tol: 1%; Package: RES-0.250W; EDM-PN: *; Text2: *; Text1: *
footprint RES-0.250W (Res 0.25W 7.6x2.3mm)
pins: 1, 2

## 62K-0.250W-0.1%
designator R?, comment value 62K  Watt: 0.25W  (hidden comment: 62K-0.250W-0.1%_H)
Resistor Metal Film; Manufacturer: Various; Part Number: 62K 0.1% 0.25W; Tol: 0.1%; Package: RES-0.250W; EDM-PN: *; Text2: *; Text1: *
footprint RES-0.250W (Res 0.25W 7.6x2.3mm)
pins: 1, 2

## 62K-0.250W-1%
designator R?, comment value 62K  Watt: 0.25W  (hidden comment: 62K-0.250W-1%_H)
Resistor Metal Film; Manufacturer: Various; Part Number: 62K 1% 0.25W; Tol: 1%; Package: RES-0.250W; EDM-PN: *; Text2: *; Text1: *
footprint RES-0.250W (Res 0.25W 7.6x2.3mm)
pins: 1, 2

## 62K-0.250W-5%
designator R?, comment value 62K  Watt: 0.25W  (hidden comment: 62K-0.250W-5%_H)
Resistor Carbon; Manufacturer: Various; Part Number: 62K 5% 0.25W; Tol: 5%; Package: RES-0.250W; EDM-PN: *; Text2: *; Text1: *
footprint RES-0.250W (Res 0.25W 7.6x2.3mm)
pins: 1, 2

## 68K-0.250W-1%
designator R?, comment value 68K  Watt: 0.25W  (hidden comment: 68K-0.250W-1%_H)
Resistor Metal Film; Manufacturer: Various; Part Number: 68K 1% 0.25W; Tol: 1%; Package: RES-0.250W; EDM-PN: *; Text2: *; Text1: *
footprint RES-0.250W (Res 0.25W 7.6x2.3mm)
pins: 1, 2

## 68R-0.250W-1%
designator R?, comment value 68R  Watt: 0.25W  (hidden comment: 68R-0.250W-1%_H)
Resistor Metal Film; Manufacturer: Various; Part Number: 68R 1% 0.25W; Tol: 1%; Package: RES-0.250W; EDM-PN: *; Text2: *; Text1: *
footprint RES-0.250W (Res 0.25W 7.6x2.3mm)
pins: 1, 2

## 68R-0.250W-2%-MOF
designator R?, comment value 68R  Watt: 0.25W  (hidden comment: 68R-0.250W-2%)
Resistor Metal Oxide Film; Manufacturer: Various; Part Number: 68R 2% 0.25W MOF; Tol: 2%; Package: RES-0.250W; EDM-PN: *; Text2: *; Text1: *
footprint RES-0.250W (Res 0.25W 7.6x2.3mm)
pins: 1, 2

## 68R-0.250W-2%-MOF-500
designator R?, comment value 68R  Watt: 0.25W  (hidden comment: 68R-0.250W-2%)
Resistor Metal Oxide Film; Manufacturer: Various; Part Number: 68R 2% 0.25W MOF; Tol: 2%; Package: RES-0.250W-500; EDM-PN: *; Text2: *; Text1: *
footprint RES-0.250W-500 (Res 0.25W 7.6x2.3mm)
pins: 1, 2

## 68R-5W-5%-WW
designator R?  value 68R  Watt: 5W  (hidden comment: 68R-5W-5%-WW)
Resistor Wirewound; Manufacturer: Various; Part Number: 68R 5% 5W WW; Tol: 5%; Package: RES-5W-WW; EDM-PN: *; Text2: *; Text1: *
footprint Res-5W-WW (Res 5W WW 17.0x7.5mm)
pins: 1, 2

## 68R-7.5W-1%_RH005
designator R?  value 68R  Watt: 7.5W  (hidden comment: 68R-7.5W-1%_RH005)
Resistor Chassis Mount Aluminum 7.5Watt; Manufacturer: Vishay; Part Number: RH00568R00FC02; Tol: 1%; Package: RES-AL 5W; EDM-PN: *; Text2: *; Text1: *
footprint RES-AL 5W (RH005 11.28x8.84mm)
pins: 1, 2

## 68R-7.5W-1%_RH005-BODY
designator R?, comment value 68R  Watt: 7.5W  (hidden comment: 68R-7.5W-1%_RH005)
Resistor Chassis Mount Aluminum 7.5Watt; Manufacturer: Vishay; Part Number: RH00568R00FC02; Tol: 1%; Package: RES-AL 5W Body; EDM-PN: *; Text2: *; Text1: *
footprint RES-AL 5W Body (RH005 11.28x8.84mm)
text: NC

## 68R-10W-1%_Alu
designator R?  value 68R  Watt: 10W  (hidden comment: 68R-10W-1%_Alu)
Resistor Chassis Mount Aluminum; Manufacturer: Various; Part Number: 68R 10W 1% Aluminum; Tol: 1%; Package: RES-AL 10W; EDM-PN: *; Text2: *; Text1: *
footprint RES-AL 10W (RH010 19.2x21.0mm)
pins: 1, 2

## 68R-10W-1%_Alu-BODY
designator R?, comment value 68R  Watt: 10W  (hidden comment: 68R-10W-1%_Alu)
Resistor Chassis Mount Aluminum; Manufacturer: Various; Part Number: 68R 10W 1% Aluminum; Tol: 1%; Package: RES-AL 10W Body; EDM-PN: *; Text2: *; Text1: *
footprint RES-AL 10W Body (RH010 19.2x21.0mm)
text: NC

## 75R-0.250W-2%-MOF
designator R?, comment value 75R  Watt: 0.25W  (hidden comment: 75R-0.250W-2%)
Resistor Metal Oxide Film; Manufacturer: Various; Part Number: 75R 2% 0.25W MOF; Tol: 2%; Package: RES-0.250W; EDM-PN: *; Text2: *; Text1: *
footprint RES-0.250W (Res 0.25W 7.6x2.3mm)
pins: 1, 2

## 75R-0.250W-2%-MOF-500
designator R?, comment value 75R  Watt: 0.25W  (hidden comment: 75R-0.250W-2%)
Resistor Metal Oxide Film; Manufacturer: Various; Part Number: 75R 2% 0.25W MOF; Tol: 2%; Package: RES-0.250W-500; EDM-PN: *; Text2: *; Text1: *
footprint RES-0.250W-500 (Res 0.25W 7.6x2.3mm)
pins: 1, 2

## 100K-0.250W-1%
designator R?, comment value 100K  Watt: 0.25W  (hidden comment: 100K-0.250W-1%_H)
Resistor Metal Film; Manufacturer: Various; Part Number: 100K 1% 0.25W; Tol: 1%; Package: RES-0.250W; EDM-PN: *; Text2: *; Text1: *
footprint RES-0.250W (Res 0.25W 7.6x2.3mm)
pins: 1, 2

## 100K-1W-5%_CFR100
designator R?, comment value 100K  Watt: 1W  (hidden comment: 100K-1W-5%_CFR100_H)
Resistor Carbon Film; Manufacturer: Tyco; Part Number: CFR100J100K; Tol: 5%; Package: RES-CFR100; EDM-PN: *; Text2: *; Text1: *
footprint RES-CFR100 (RES CFR100 12.0x5.0mm)
pins: 1, 2

## 100R-0.5W-1%
designator R?  value 100R  Watt: 0.5W  (hidden comment: 100R-0.5W-1%)
Resistor Metal Film; Manufacturer: Various; Part Number: 100R 1% 0.5W; Tol: 1%; Package: RES-0.5W; EDM-PN: *; Text2: *; Text1: *
footprint RES-0.5W (RES-0.5W 10.0x3.8mm)
pins: 1, 2

## 100R-0.5W-2%-MOF-600
designator R?, comment value 100R  Watt: 0.5W  (hidden comment: 100R-0.5W-2%)
Resistor Metal Oxide Film; Manufacturer: Various; Part Number: 100R 2% 0.5W MOF; Tol: 2%; Package: RES-0.5W-600; EDM-PN: *; Text2: *; Text1: *
footprint RES-0.5W-600 (RES-0.5W 10.0x3.8mm)
pins: 1, 2

## 100R-0.250W-1%
designator R?, comment value 100R  Watt: 0.25W  (hidden comment: 100R-0.250W-1%_H)
Resistor Metal Film; Manufacturer: Various; Part Number: 100R 1% 0.25W; Tol: 1%; Package: RES-0.250W; EDM-PN: *; Text2: *; Text1: *
footprint RES-0.250W (Res 0.25W 7.6x2.3mm)
pins: 1, 2

## 100R-0.250W-2%-MOF
designator R?, comment value 100R  Watt: 0.25W  (hidden comment: 100R-0.250W-2%)
Resistor Metal Oxide Film; Manufacturer: Various; Part Number: 100R 2% 0.25W MOF; Tol: 2%; Package: RES-0.250W; EDM-PN: *; Text2: *; Text1: *
footprint RES-0.250W (Res 0.25W 7.6x2.3mm)
pins: 1, 2

## 100R-0.250W-2%-MOF-500
designator R?, comment value 100R  Watt: 0.25W  (hidden comment: 100R-0.250W-2%)
Resistor Metal Oxide Film; Manufacturer: Various; Part Number: 100R 2% 0.25W MOF; Tol: 2%; Package: RES-0.250W-500; EDM-PN: *; Text2: *; Text1: *
footprint RES-0.250W-500 (Res 0.25W 7.6x2.3mm)
pins: 1, 2

## 100R-1W-AC01-5%-WW
designator R?  value 100R  Watt: 1W  (hidden comment: 100R-1W-AC01-5%-WW)
Resistor Wirewound; Manufacturer: Vishay; Part Number: AC01000001000JA100; Tol: 5%; Package: RES-AC01; EDM-PN: *; Text2: *; Text1: *
footprint RES-AC01 (AC03 11.0x4.3mm)
pins: 1, 2
